# Altium schematic symbol library Regulator_Switching.SchLib: 1070 symbols (part 5 of 9) (continued)
## NCP1071STCT
designator *  value NCP1071STCT
ki_keywords: SMPS Converter; ki_description: High-Voltage Switcher for Low Power Offline SMPS, 700V Vds, 14W/7.75W, 230V/85-265V, 130kHz, 22Ohm Rds(on), 350mA Ipk, SOT-223; ki_fp_filters: SOT?223*; Footprint: Package_TO_SOT_SMD:SOT-223; Supplier: http://www.onsemi.com/pub/Collateral/NCP1070-D.PDF
footprint SOT-223
pins: 1 VCC (power), 2 FB (in), 3 DRAIN (oc), 4 GND (power)

## NCP1072P065
designator *  value NCP1072P065
ki_keywords: SMPS Converter; ki_description: High-Voltage Switcher for Low Power Offline SMPS, 700V Vds, 19W/10W, 230V/85-265V, 65kHz, 11Ohm Rds(on), 250mA Ipk, DIP-7; ki_fp_filters: DIP*N7*W7.62mm*; Footprint: Package_DIP:DIP-8-N7_W7.62mm; Supplier: http://www.onsemi.com/pub/Collateral/NCP1070-D.PDF
footprint DIP-8-N7_W7.62mm
pins: 1 VCC (power), 2 NC (in) hidden, 3 GND (power), 4 FB (in), 5 DRAIN (oc), 7 GND hidden, 8 GND hidden

## NCP1072P100
designator *  value NCP1072P100
ki_keywords: SMPS Converter; ki_description: High-Voltage Switcher for Low Power Offline SMPS, 700V Vds, 19W/10W, 230V/85-265V, 100kHz, 11Ohm Rds(on), 250mA Ipk, DIP-7; ki_fp_filters: DIP*N7*W7.62mm*; Footprint: Package_DIP:DIP-8-N7_W7.62mm; Supplier: http://www.onsemi.com/pub/Collateral/NCP1070-D.PDF
footprint DIP-8-N7_W7.62mm
pins: 1 VCC (power), 2 NC (in) hidden, 3 GND (power), 4 FB (in), 5 DRAIN (oc), 7 GND hidden, 8 GND hidden

## NCP1072P130
designator *  value NCP1072P130
ki_keywords: SMPS Converter; ki_description: High-Voltage Switcher for Low Power Offline SMPS, 700V Vds, 19W/10W, 230V/85-265V, 130kHz, 11Ohm Rds(on), 250mA Ipk, DIP-7; ki_fp_filters: DIP*N7*W7.62mm*; Footprint: Package_DIP:DIP-8-N7_W7.62mm; Supplier: http://www.onsemi.com/pub/Collateral/NCP1070-D.PDF
footprint DIP-8-N7_W7.62mm
pins: 1 VCC (power), 2 NC (in) hidden, 3 GND (power), 4 FB (in), 5 DRAIN (oc), 7 GND hidden, 8 GND hidden

## NCP1072STAT
designator *  value NCP1072STAT
ki_keywords: SMPS Converter; ki_description: High-Voltage Switcher for Low Power Offline SMPS, 700V Vds, 19W/10W, 230V/85-265V, 65kHz, 11Ohm Rds(on), 250mA Ipk, SOT-223; ki_fp_filters: SOT?223*; Footprint: Package_TO_SOT_SMD:SOT-223; Supplier: http://www.onsemi.com/pub/Collateral/NCP1070-D.PDF
footprint SOT-223
pins: 1 VCC (power), 2 FB (in), 3 DRAIN (oc), 4 GND (power)

## NCP1072STBT
designator *  value NCP1072STBT
ki_keywords: SMPS Converter; ki_description: High-Voltage Switcher for Low Power Offline SMPS, 700V Vds, 19W/10W, 230V/85-265V, 100kHz, 11Ohm Rds(on), 250mA Ipk, SOT-223; ki_fp_filters: SOT?223*; Footprint: Package_TO_SOT_SMD:SOT-223; Supplier: http://www.onsemi.com/pub/Collateral/NCP1070-D.PDF
footprint SOT-223
pins: 1 VCC (power), 2 FB (in), 3 DRAIN (oc), 4 GND (power)

## NCP1072STCT
designator *  value NCP1072STCT
ki_keywords: SMPS Converter; ki_description: High-Voltage Switcher for Low Power Offline SMPS, 700V Vds, 19W/10W, 230V/85-265V, 130kHz, 11Ohm Rds(on), 250mA Ipk, SOT-223; ki_fp_filters: SOT?223*; Footprint: Package_TO_SOT_SMD:SOT-223; Supplier: http://www.onsemi.com/pub/Collateral/NCP1070-D.PDF
footprint SOT-223
pins: 1 VCC (power), 2 FB (in), 3 DRAIN (oc), 4 GND (power)

## NCP1075P065
designator *  value NCP1075P065
ki_keywords: SMPS Converter; ki_description: High-Voltage Switcher for Low Power Offline SMPS, 700V Vds, 19W/10W, 230V/85-265V, 65kHz, 11Ohm Rds(on), 450mA Ipk, DIP-7; ki_fp_filters: DIP*N7*W7.62mm*; Footprint: Package_DIP:DIP-8-N7_W7.62mm; Supplier: http://www.onsemi.com/pub/Collateral/NCP1070-D.PDF
footprint DIP-8-N7_W7.62mm
pins: 1 VCC (power), 2 NC (in) hidden, 3 GND (power), 4 FB (in), 5 DRAIN (oc), 7 GND hidden, 8 GND hidden

## NCP1075P100
designator *  value NCP1075P100
ki_keywords: SMPS Converter; ki_description: High-Voltage Switcher for Low Power Offline SMPS, 700V Vds, 19W/10W, 230V/85-265V, 100kHz, 11Ohm Rds(on), 450mA Ipk, DIP-7; ki_fp_filters: DIP*N7*W7.62mm*; Footprint: Package_DIP:DIP-8-N7_W7.62mm; Supplier: http://www.onsemi.com/pub/Collateral/NCP1070-D.PDF
footprint DIP-8-N7_W7.62mm
pins: 1 VCC (power), 2 NC (in) hidden, 3 GND (power), 4 FB (in), 5 DRAIN (oc), 7 GND hidden, 8 GND hidden

## NCP1075P130
designator *  value NCP1075P130
ki_keywords: SMPS Converter; ki_description: High-Voltage Switcher for Low Power Offline SMPS, 700V Vds, 19W/10W, 230V/85-265V, 130kHz, 11Ohm Rds(on), 450mA Ipk, DIP-7; ki_fp_filters: DIP*N7*W7.62mm*; Footprint: Package_DIP:DIP-8-N7_W7.62mm; Supplier: http://www.onsemi.com/pub/Collateral/NCP1070-D.PDF
footprint DIP-8-N7_W7.62mm
pins: 1 VCC (power), 2 NC (in) hidden, 3 GND (power), 4 FB (in), 5 DRAIN (oc), 7 GND hidden, 8 GND hidden

## NCP1075STAT
designator *  value NCP1075STAT
ki_keywords: SMPS Converter; ki_description: High-Voltage Switcher for Low Power Offline SMPS, 700V Vds, 19W/10W, 230V/85-265V, 65kHz, 11Ohm Rds(on), 450mA Ipk, SOT-223; ki_fp_filters: SOT?223*; Footprint: Package_TO_SOT_SMD:SOT-223; Supplier: http://www.onsemi.com/pub/Collateral/NCP1070-D.PDF
footprint SOT-223
pins: 1 VCC (power), 2 FB (in), 3 DRAIN (oc), 4 GND (power)

## NCP1075STBT
designator *  value NCP1075STBT
ki_keywords: SMPS Converter; ki_description: High-Voltage Switcher for Low Power Offline SMPS, 700V Vds, 19W/10W, 230V/85-265V, 100kHz, 11Ohm Rds(on), 450mA Ipk, SOT-223; ki_fp_filters: SOT?223*; Footprint: Package_TO_SOT_SMD:SOT-223; Supplier: http://www.onsemi.com/pub/Collateral/NCP1070-D.PDF
footprint SOT-223
pins: 1 VCC (power), 2 FB (in), 3 DRAIN (oc), 4 GND (power)

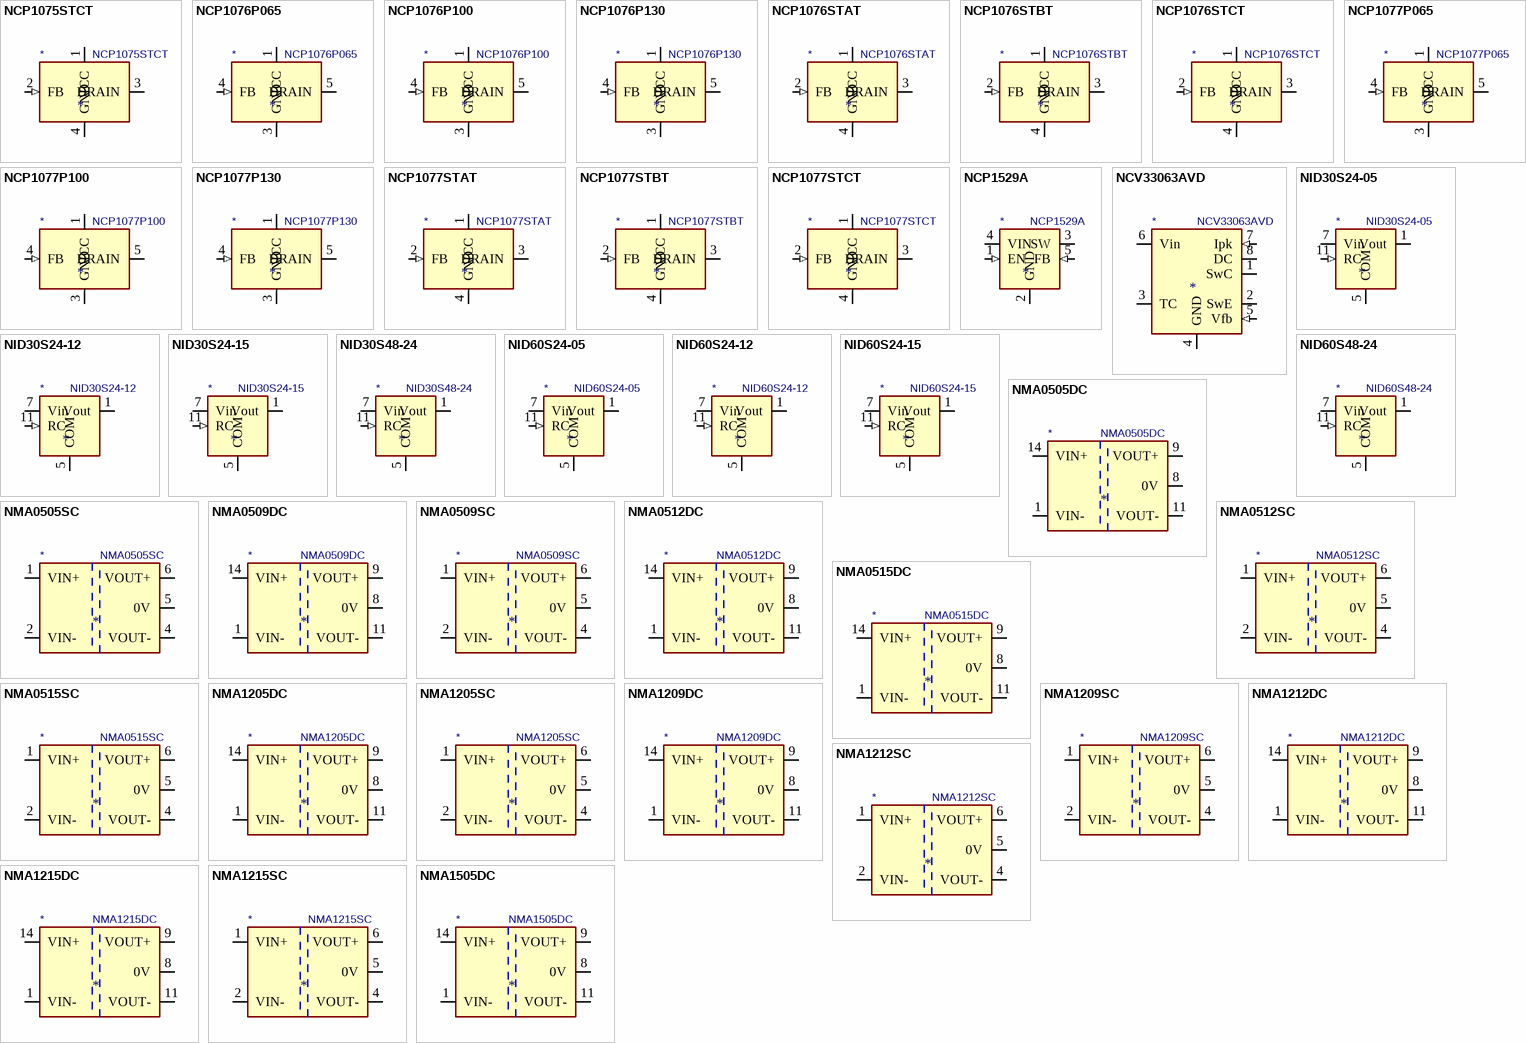
[diagram p15: symbols NCP1075STCT to NMA1505DC]

## NCP1075STCT
designator *  value NCP1075STCT
ki_keywords: SMPS Converter; ki_description: High-Voltage Switcher for Low Power Offline SMPS, 700V Vds, 19W/10W, 230V/85-265V, 130kHz, 11Ohm Rds(on), 450mA Ipk, SOT-223; ki_fp_filters: SOT?223*; Footprint: Package_TO_SOT_SMD:SOT-223; Supplier: http://www.onsemi.com/pub/Collateral/NCP1070-D.PDF
footprint SOT-223
pins: 1 VCC (power), 2 FB (in), 3 DRAIN (oc), 4 GND (power)

## NCP1076P065
designator *  value NCP1076P065
ki_keywords: SMPS Converter; ki_description: High-Voltage Switcher for Low Power Offline SMPS, 700V Vds, 25W/15W, 230V/85-265V, 65kHz, 4.7Ohm Rds(on), 650mA Ipk, DIP-7; ki_fp_filters: DIP*N7*W7.62mm*; Footprint: Package_DIP:DIP-8-N7_W7.62mm; Supplier: http://www.onsemi.com/pub/Collateral/NCP1070-D.PDF
footprint DIP-8-N7_W7.62mm
pins: 1 VCC (power), 2 NC (in) hidden, 3 GND (power), 4 FB (in), 5 DRAIN (oc), 7 GND hidden, 8 GND hidden

## NCP1076P100
designator *  value NCP1076P100
ki_keywords: SMPS Converter; ki_description: High-Voltage Switcher for Low Power Offline SMPS, 700V Vds, 25W/15W, 230V/85-265V, 100kHz, 4.7Ohm Rds(on), 650mA Ipk, DIP-7; ki_fp_filters: DIP*N7*W7.62mm*; Footprint: Package_DIP:DIP-8-N7_W7.62mm; Supplier: http://www.onsemi.com/pub/Collateral/NCP1070-D.PDF
footprint DIP-8-N7_W7.62mm
pins: 1 VCC (power), 2 NC (in) hidden, 3 GND (power), 4 FB (in), 5 DRAIN (oc), 7 GND hidden, 8 GND hidden

## NCP1076P130
designator *  value NCP1076P130
ki_keywords: SMPS Converter; ki_description: High-Voltage Switcher for Low Power Offline SMPS, 700V Vds, 25W/15W, 230V/85-265V, 130kHz, 4.7Ohm Rds(on), 650mA Ipk, DIP-7; ki_fp_filters: DIP*N7*W7.62mm*; Footprint: Package_DIP:DIP-8-N7_W7.62mm; Supplier: http://www.onsemi.com/pub/Collateral/NCP1070-D.PDF
footprint DIP-8-N7_W7.62mm
pins: 1 VCC (power), 2 NC (in) hidden, 3 GND (power), 4 FB (in), 5 DRAIN (oc), 7 GND hidden, 8 GND hidden

## NCP1076STAT
designator *  value NCP1076STAT
ki_keywords: SMPS Converter; ki_description: High-Voltage Switcher for Low Power Offline SMPS, 700V Vds, 25W/15W, 230V/85-265V, 65kHz, 4.7Ohm Rds(on), 650mA Ipk, SOT-223; ki_fp_filters: SOT?223*; Footprint: Package_TO_SOT_SMD:SOT-223; Supplier: http://www.onsemi.com/pub/Collateral/NCP1070-D.PDF
footprint SOT-223
pins: 1 VCC (power), 2 FB (in), 3 DRAIN (oc), 4 GND (power)

## NCP1076STBT
designator *  value NCP1076STBT
ki_keywords: SMPS Converter; ki_description: High-Voltage Switcher for Low Power Offline SMPS, 700V Vds, 25W/15W, 230V/85-265V, 100kHz, 4.7Ohm Rds(on), 650mA Ipk, SOT-223; ki_fp_filters: SOT?223*; Footprint: Package_TO_SOT_SMD:SOT-223; Supplier: http://www.onsemi.com/pub/Collateral/NCP1070-D.PDF
footprint SOT-223
pins: 1 VCC (power), 2 FB (in), 3 DRAIN (oc), 4 GND (power)

## NCP1076STCT
designator *  value NCP1076STCT
ki_keywords: SMPS Converter; ki_description: High-Voltage Switcher for Low Power Offline SMPS, 700V Vds, 25W/15W, 230V/85-265V, 130kHz, 4.7Ohm Rds(on), 650mA Ipk, SOT-223; ki_fp_filters: SOT?223*; Footprint: Package_TO_SOT_SMD:SOT-223; Supplier: http://www.onsemi.com/pub/Collateral/NCP1070-D.PDF
footprint SOT-223
pins: 1 VCC (power), 2 FB (in), 3 DRAIN (oc), 4 GND (power)

## NCP1077P065
designator *  value NCP1077P065
ki_keywords: SMPS Converter; ki_description: High-Voltage Switcher for Low Power Offline SMPS, 700V Vds, 25W/15W, 230V/85-265V, 65kHz, 4.7Ohm Rds(on), 800mA Ipk, DIP-7; ki_fp_filters: DIP*N7*W7.62mm*; Footprint: Package_DIP:DIP-8-N7_W7.62mm; Supplier: http://www.onsemi.com/pub/Collateral/NCP1070-D.PDF
footprint DIP-8-N7_W7.62mm
pins: 1 VCC (power), 2 NC (in) hidden, 3 GND (power), 4 FB (in), 5 DRAIN (oc), 7 GND hidden, 8 GND hidden

## NCP1077P100
designator *  value NCP1077P100
ki_keywords: SMPS Converter; ki_description: High-Voltage Switcher for Low Power Offline SMPS, 700V Vds, 25W/15W, 230V/85-265V, 100kHz, 4.7Ohm Rds(on), 800mA Ipk, DIP-7; ki_fp_filters: DIP*N7*W7.62mm*; Footprint: Package_DIP:DIP-8-N7_W7.62mm; Supplier: http://www.onsemi.com/pub/Collateral/NCP1070-D.PDF
footprint DIP-8-N7_W7.62mm
pins: 1 VCC (power), 2 NC (in) hidden, 3 GND (power), 4 FB (in), 5 DRAIN (oc), 7 GND hidden, 8 GND hidden

## NCP1077P130
designator *  value NCP1077P130
ki_keywords: SMPS Converter; ki_description: High-Voltage Switcher for Low Power Offline SMPS, 700V Vds, 25W/15W, 230V/85-265V, 130kHz, 4.7Ohm Rds(on), 800mA Ipk, DIP-7; ki_fp_filters: DIP*N7*W7.62mm*; Footprint: Package_DIP:DIP-8-N7_W7.62mm; Supplier: http://www.onsemi.com/pub/Collateral/NCP1070-D.PDF
footprint DIP-8-N7_W7.62mm
pins: 1 VCC (power), 2 NC (in) hidden, 3 GND (power), 4 FB (in), 5 DRAIN (oc), 7 GND hidden, 8 GND hidden

## NCP1077STAT
designator *  value NCP1077STAT
ki_keywords: SMPS Converter; ki_description: High-Voltage Switcher for Low Power Offline SMPS, 700V Vds, 25W/15W, 230V/85-265V, 65kHz, 4.7Ohm Rds(on), 800mA Ipk, SOT-223; ki_fp_filters: SOT?223*; Footprint: Package_TO_SOT_SMD:SOT-223; Supplier: http://www.onsemi.com/pub/Collateral/NCP1070-D.PDF
footprint SOT-223
pins: 1 VCC (power), 2 FB (in), 3 DRAIN (oc), 4 GND (power)

## NCP1077STBT
designator *  value NCP1077STBT
ki_keywords: SMPS Converter; ki_description: High-Voltage Switcher for Low Power Offline SMPS, 700V Vds, 25W/15W, 230V/85-265V, 100kHz, 4.7Ohm Rds(on), 800mA Ipk, SOT-223; ki_fp_filters: SOT?223*; Footprint: Package_TO_SOT_SMD:SOT-223; Supplier: http://www.onsemi.com/pub/Collateral/NCP1070-D.PDF
footprint SOT-223
pins: 1 VCC (power), 2 FB (in), 3 DRAIN (oc), 4 GND (power)

## NCP1077STCT
designator *  value NCP1077STCT
ki_keywords: SMPS Converter; ki_description: High-Voltage Switcher for Low Power Offline SMPS, 700V Vds, 25W/15W, 230V/85-265V, 130kHz, 4.7Ohm Rds(on), 800mA Ipk, SOT-223; ki_fp_filters: SOT?223*; Footprint: Package_TO_SOT_SMD:SOT-223; Supplier: http://www.onsemi.com/pub/Collateral/NCP1070-D.PDF
footprint SOT-223
pins: 1 VCC (power), 2 FB (in), 3 DRAIN (oc), 4 GND (power)

## NCP1529A
designator *  value NCP1529A
ki_keywords: Step-Down Buck DC-DC Regulator Adjustable; ki_description: 1.7MHz, 1A, High Efficiency, Low Ripple, Adjustable Output Voltage Step-down Converter, SOT-23-5; ki_fp_filters: SOT?23*; Footprint: Package_TO_SOT_SMD:SOT-23-5; Supplier: https://www.onsemi.com/pub/Collateral/NCP1529-D.PDF
footprint SOT-23-5
pins: 1 EN (in), 2 GND (power), 3 SW (power), 4 VIN (power), 5 FB (in)

## NCV33063AVD
designator *  value NCV33063AVD
ki_keywords: smps buck boost inverting; ki_description: 1.5A, step-up/down/inverting switching regulator, 3-40V Vin, 100kHz, SO-8; ki_fp_filters: SOIC*3.9x4.9mm*P1.27mm*; Footprint: Package_SO:SOIC-8_3.9x4.9mm_P1.27mm; Supplier: http://www.onsemi.com/pub_link/Collateral/MC34063A-D.PDF
footprint SOIC-8_3.9x4.9mm_P1.27mm
pins: 1 SwC (oc), 2 SwE (oe), 3 TC, 4 GND (power), 5 Vfb (in), 6 Vin (power), 7 Ipk (in), 8 DC (oc)

## NID30S24-05
designator *  value NID30S24-05
ki_keywords: Step-Down Converter Module DC/DC; ki_description: 2.5A/12.5W Step Down Converter Module, fixed 5V Output Voltage, 250kHz, 20-53V Input Voltage; ki_fp_filters: Converter*DCDC*MeanWell*NID30*THT*; Footprint: Converter_DCDC:Converter_DCDC_MeanWell_NID30_THT; Supplier: http://www.meanwell.com/webapp/product/search.aspx?prod=nid30
footprint Converter_DCDC_MeanWell_NID30_THT
pins: 1 Vout (power), 2 Vout hidden, 3 Vout hidden, 4 Vout hidden, 5 COM (power), 6 COM hidden, 7 Vin (power), 8 Vin hidden, 9 NC (in) hidden, 10 NC (in) hidden, 11 RC (in)

## NID30S24-12
designator *  value NID30S24-12
ki_keywords: Step-Down Converter Module DC/DC; ki_description: 2.5A/30W Step Down Converter Module, fixed 12V Output Voltage, 250kHz, 20-53V Input Voltage; ki_fp_filters: Converter*DCDC*MeanWell*NID30*THT*; Footprint: Converter_DCDC:Converter_DCDC_MeanWell_NID30_THT; Supplier: http://www.meanwell.com/webapp/product/search.aspx?prod=nid30
footprint Converter_DCDC_MeanWell_NID30_THT
pins: 1 Vout (power), 2 Vout hidden, 3 Vout hidden, 4 Vout hidden, 5 COM (power), 6 COM hidden, 7 Vin (power), 8 Vin hidden, 9 NC (in) hidden, 10 NC (in) hidden, 11 RC (in)

## NID30S24-15
designator *  value NID30S24-15
ki_keywords: Step-Down Converter Module DC/DC; ki_description: 2.5A/30W Step Down Converter Module, fixed 15V Output Voltage, 250kHz, 20-53V Input Voltage; ki_fp_filters: Converter*DCDC*MeanWell*NID30*THT*; Footprint: Converter_DCDC:Converter_DCDC_MeanWell_NID30_THT; Supplier: http://www.meanwell.com/webapp/product/search.aspx?prod=nid30
footprint Converter_DCDC_MeanWell_NID30_THT
pins: 1 Vout (power), 2 Vout hidden, 3 Vout hidden, 4 Vout hidden, 5 COM (power), 6 COM hidden, 7 Vin (power), 8 Vin hidden, 9 NC (in) hidden, 10 NC (in) hidden, 11 RC (in)

## NID30S48-24
designator *  value NID30S48-24
ki_keywords: Step-Down Converter Module DC/DC; ki_description: 1.25A/30W Step Down Converter Module, fixed 24V Output Voltage, 250kHz, 30-53V Input Voltage; ki_fp_filters: Converter*DCDC*MeanWell*NID30*THT*; Footprint: Converter_DCDC:Converter_DCDC_MeanWell_NID30_THT; Supplier: http://www.meanwell.com/webapp/product/search.aspx?prod=nid30
footprint Converter_DCDC_MeanWell_NID30_THT
pins: 1 Vout (power), 2 Vout hidden, 3 Vout hidden, 4 Vout hidden, 5 COM (power), 6 COM hidden, 7 Vin (power), 8 Vin hidden, 9 NC (in) hidden, 10 NC (in) hidden, 11 RC (in)

## NID60S24-05
designator *  value NID60S24-05
ki_keywords: Step-Down Converter Module DC/DC; ki_description: 4A/20W Step Down Converter Module, fixed 5V Output Voltage, 250kHz, 20-53V Input Voltage; ki_fp_filters: Converter*DCDC*MeanWell*NID60*; Footprint: Converter_DCDC:Converter_DCDC_MeanWell_NID60_THT; Supplier: http://www.meanwell.com/78ddf876-a86c-4a52-8a41-4ee24dd9913d
footprint Converter_DCDC_MeanWell_NID60_THT
pins: 1 Vout (power), 2 Vout hidden, 3 Vout hidden, 4 Vout hidden, 5 COM (power), 6 COM hidden, 7 Vin (power), 8 Vin hidden, 9 NC (in) hidden, 10 NC (in) hidden, 11 RC (in)

## NID60S24-12
designator *  value NID60S24-12
ki_keywords: Step-Down Converter Module DC/DC; ki_description: 4A/48W Step Down Converter Module, fixed 12V Output Voltage, 250kHz, 20-53V Input Voltage; ki_fp_filters: Converter*DCDC*MeanWell*NID60*; Footprint: Converter_DCDC:Converter_DCDC_MeanWell_NID60_THT; Supplier: http://www.meanwell.com/78ddf876-a86c-4a52-8a41-4ee24dd9913d
footprint Converter_DCDC_MeanWell_NID60_THT
pins: 1 Vout (power), 2 Vout hidden, 3 Vout hidden, 4 Vout hidden, 5 COM (power), 6 COM hidden, 7 Vin (power), 8 Vin hidden, 9 NC (in) hidden, 10 NC (in) hidden, 11 RC (in)

## NID60S24-15
designator *  value NID60S24-15
ki_keywords: Step-Down Converter Module DC/DC; ki_description: 4A/60W Step Down Converter Module, fixed 15V Output Voltage, 250kHz, 20-53V Input Voltage; ki_fp_filters: Converter*DCDC*MeanWell*NID60*; Footprint: Converter_DCDC:Converter_DCDC_MeanWell_NID60_THT; Supplier: http://www.meanwell.com/78ddf876-a86c-4a52-8a41-4ee24dd9913d
footprint Converter_DCDC_MeanWell_NID60_THT
pins: 1 Vout (power), 2 Vout hidden, 3 Vout hidden, 4 Vout hidden, 5 COM (power), 6 COM hidden, 7 Vin (power), 8 Vin hidden, 9 NC (in) hidden, 10 NC (in) hidden, 11 RC (in)

## NID60S48-24
designator *  value NID60S48-24
ki_keywords: Step-Down Converter Module DC/DC; ki_description: 2.5A/60W Step Down Converter Module, fixed 24V Output Voltage, 250kHz, 30-53V Input Voltage; ki_fp_filters: Converter*DCDC*MeanWell*NID60*; Footprint: Converter_DCDC:Converter_DCDC_MeanWell_NID60_THT; Supplier: http://www.meanwell.com/78ddf876-a86c-4a52-8a41-4ee24dd9913d
footprint Converter_DCDC_MeanWell_NID60_THT
pins: 1 Vout (power), 2 Vout hidden, 3 Vout hidden, 4 Vout hidden, 5 COM (power), 6 COM hidden, 7 Vin (power), 8 Vin hidden, 9 NC (in) hidden, 10 NC (in) hidden, 11 RC (in)

## NMA0505DC
designator *  value NMA0505DC
ki_keywords: Murata isolated isolation dc-dc converter; ki_description: +/-100mA Isolated 1W Dual output DC/DC Converter, 5V Input Voltage, +/-5V Output Voltage, DIP Package; ki_fp_filters: Converter*DCDC*Murata*NMAxxxxDC*; Footprint: Converter_DCDC:Converter_DCDC_Murata_NMAxxxxDC_THT; Supplier: http://power.murata.com/data/power/ncl/kdc_nma.pdf
footprint Converter_DCDC_Murata_NMAxxxxDC_THT
pins: 1 VIN- (power), 7 NC (in) hidden, 8 0V (power), 9 VOUT+ (power), 11 VOUT- (power), 14 VIN+ (power)

## NMA0505SC
designator *  value NMA0505SC
ki_keywords: Murata isolated isolation dc-dc converter; ki_description: +/-100mA Isolated 1W Dual output DC/DC Converter Module, 5V Input Voltage, +/-5V Output Voltage, SIP3; ki_fp_filters: Converter*DCDC*Murata*NMAxxxxSC*; Footprint: Converter_DCDC:Converter_DCDC_Murata_NMAxxxxSC_THT; Supplier: http://power.murata.com/data/power/ncl/kdc_nma.pdf
footprint Converter_DCDC_Murata_NMAxxxxSC_THT
pins: 1 VIN+ (power), 2 VIN- (power), 4 VOUT- (power), 5 0V (power), 6 VOUT+ (power)

## NMA0509DC
designator *  value NMA0509DC
ki_keywords: Murata isolated isolation dc-dc converter; ki_description: +/-55mA Isolated 1W Dual output DC/DC Converter Module, 5V Input Voltage, +/-9V Output Voltage, DIP Package; ki_fp_filters: Converter*DCDC*Murata*NMAxxxxDC*; Footprint: Converter_DCDC:Converter_DCDC_Murata_NMAxxxxDC_THT; Supplier: http://power.murata.com/data/power/ncl/kdc_nma.pdf
footprint Converter_DCDC_Murata_NMAxxxxDC_THT
pins: 1 VIN- (power), 7 NC (in) hidden, 8 0V (power), 9 VOUT+ (power), 11 VOUT- (power), 14 VIN+ (power)

## NMA0509SC
designator *  value NMA0509SC
ki_keywords: Murata isolated isolation dc-dc converter; ki_description: +/-55mA Isolated 1W Dual output DC/DC Converter Module, 5V Input Voltage, +/-9V Output Voltage, SIP3; ki_fp_filters: Converter*DCDC*Murata*NMAxxxxSC*; Footprint: Converter_DCDC:Converter_DCDC_Murata_NMAxxxxSC_THT; Supplier: http://power.murata.com/data/power/ncl/kdc_nma.pdf
footprint Converter_DCDC_Murata_NMAxxxxSC_THT
pins: 1 VIN+ (power), 2 VIN- (power), 4 VOUT- (power), 5 0V (power), 6 VOUT+ (power)

## NMA0512DC
designator *  value NMA0512DC
ki_keywords: Murata isolated isolation dc-dc converter; ki_description: +/-42mA Isolated 1W Dual output DC/DC Converter Module, 5V Input Voltage, +/-12V Output Voltage, DIP Package; ki_fp_filters: Converter*DCDC*Murata*NMAxxxxDC*; Footprint: Converter_DCDC:Converter_DCDC_Murata_NMAxxxxDC_THT; Supplier: http://power.murata.com/data/power/ncl/kdc_nma.pdf
footprint Converter_DCDC_Murata_NMAxxxxDC_THT
pins: 1 VIN- (power), 7 NC (in) hidden, 8 0V (power), 9 VOUT+ (power), 11 VOUT- (power), 14 VIN+ (power)

## NMA0512SC
designator *  value NMA0512SC
ki_keywords: Murata isolated isolation dc-dc converter; ki_description: +/-42mA Isolated 1W Dual output DC/DC Converter Module, 5V Input Voltage, +/-12V Output Voltage, SIP3; ki_fp_filters: Converter*DCDC*Murata*NMAxxxxSC*; Footprint: Converter_DCDC:Converter_DCDC_Murata_NMAxxxxSC_THT; Supplier: http://power.murata.com/data/power/ncl/kdc_nma.pdf
footprint Converter_DCDC_Murata_NMAxxxxSC_THT
pins: 1 VIN+ (power), 2 VIN- (power), 4 VOUT- (power), 5 0V (power), 6 VOUT+ (power)

## NMA0515DC
designator *  value NMA0515DC
ki_keywords: Murata isolated isolation dc-dc converter; ki_description: +/-33mA Isolated 1W Dual output DC/DC Converter Module, 5V Input Voltage, +/-15V Output Voltage, DIP Package; ki_fp_filters: Converter*DCDC*Murata*NMAxxxxDC*; Footprint: Converter_DCDC:Converter_DCDC_Murata_NMAxxxxDC_THT; Supplier: http://power.murata.com/data/power/ncl/kdc_nma.pdf
footprint Converter_DCDC_Murata_NMAxxxxDC_THT
pins: 1 VIN- (power), 7 NC (in) hidden, 8 0V (power), 9 VOUT+ (power), 11 VOUT- (power), 14 VIN+ (power)

## NMA0515SC
designator *  value NMA0515SC
ki_keywords: Murata isolated isolation dc-dc converter; ki_description: +/-33mA Isolated 1W Dual output DC/DC Converter Module, 5V Input Voltage, +/-15V Output Voltage, SIP3; ki_fp_filters: Converter*DCDC*Murata*NMAxxxxSC*; Footprint: Converter_DCDC:Converter_DCDC_Murata_NMAxxxxSC_THT; Supplier: http://power.murata.com/data/power/ncl/kdc_nma.pdf
footprint Converter_DCDC_Murata_NMAxxxxSC_THT
pins: 1 VIN+ (power), 2 VIN- (power), 4 VOUT- (power), 5 0V (power), 6 VOUT+ (power)

## NMA1205DC
designator *  value NMA1205DC
ki_keywords: Murata isolated isolation dc-dc converter; ki_description: +/-100mA Isolated 1W Dual output DC/DC Converter Module, 12V Input Voltage, +/-5V Output Voltage, DIP Package; ki_fp_filters: Converter*DCDC*Murata*NMAxxxxDC*; Footprint: Converter_DCDC:Converter_DCDC_Murata_NMAxxxxDC_THT; Supplier: http://power.murata.com/data/power/ncl/kdc_nma.pdf
footprint Converter_DCDC_Murata_NMAxxxxDC_THT
pins: 1 VIN- (power), 7 NC (in) hidden, 8 0V (power), 9 VOUT+ (power), 11 VOUT- (power), 14 VIN+ (power)

## NMA1205SC
designator *  value NMA1205SC
ki_keywords: Murata isolated isolation dc-dc converter; ki_description: +/-100mA Isolated 1W Dual output DC/DC Converter Module, 12V Input Voltage, +/-5V Output Voltage, SIP3; ki_fp_filters: Converter*DCDC*Murata*NMAxxxxSC*; Footprint: Converter_DCDC:Converter_DCDC_Murata_NMAxxxxSC_THT; Supplier: http://power.murata.com/data/power/ncl/kdc_nma.pdf
footprint Converter_DCDC_Murata_NMAxxxxSC_THT
pins: 1 VIN+ (power), 2 VIN- (power), 4 VOUT- (power), 5 0V (power), 6 VOUT+ (power)

## NMA1209DC
designator *  value NMA1209DC
ki_keywords: Murata isolated isolation dc-dc converter; ki_description: +/-55mA Isolated 1W Dual output DC/DC Converter Module, 12V Input Voltage, +/-9V Output Voltage, DIP Package; ki_fp_filters: Converter*DCDC*Murata*NMAxxxxDC*; Footprint: Converter_DCDC:Converter_DCDC_Murata_NMAxxxxDC_THT; Supplier: http://power.murata.com/data/power/ncl/kdc_nma.pdf
footprint Converter_DCDC_Murata_NMAxxxxDC_THT
pins: 1 VIN- (power), 7 NC (in) hidden, 8 0V (power), 9 VOUT+ (power), 11 VOUT- (power), 14 VIN+ (power)

## NMA1209SC
designator *  value NMA1209SC
ki_keywords: Murata isolated isolation dc-dc converter; ki_description: +/-55mA Isolated 1W Dual output DC/DC Converter Module, 12V Input Voltage, +/-9V Output Voltage, SIP3; ki_fp_filters: Converter*DCDC*Murata*NMAxxxxSC*; Footprint: Converter_DCDC:Converter_DCDC_Murata_NMAxxxxSC_THT; Supplier: http://power.murata.com/data/power/ncl/kdc_nma.pdf
footprint Converter_DCDC_Murata_NMAxxxxSC_THT
pins: 1 VIN+ (power), 2 VIN- (power), 4 VOUT- (power), 5 0V (power), 6 VOUT+ (power)

## NMA1212DC
designator *  value NMA1212DC
ki_keywords: Murata isolated isolation dc-dc converter; ki_description: +/-42mA Isolated 1W Dual output DC/DC Converter Module, 12V Input Voltage, +/-12V Output Voltage, DIP Package; ki_fp_filters: Converter*DCDC*Murata*NMAxxxxDC*; Footprint: Converter_DCDC:Converter_DCDC_Murata_NMAxxxxDC_THT; Supplier: http://power.murata.com/data/power/ncl/kdc_nma.pdf
footprint Converter_DCDC_Murata_NMAxxxxDC_THT
pins: 1 VIN- (power), 7 NC (in) hidden, 8 0V (power), 9 VOUT+ (power), 11 VOUT- (power), 14 VIN+ (power)

## NMA1212SC
designator *  value NMA1212SC
ki_keywords: Murata isolated isolation dc-dc converter; ki_description: +/-42mA Isolated 1W Dual output DC/DC Converter Module, 12V Input Voltage, +/-12V Output Voltage, SIP3; ki_fp_filters: Converter*DCDC*Murata*NMAxxxxSC*; Footprint: Converter_DCDC:Converter_DCDC_Murata_NMAxxxxSC_THT; Supplier: http://power.murata.com/data/power/ncl/kdc_nma.pdf
footprint Converter_DCDC_Murata_NMAxxxxSC_THT
pins: 1 VIN+ (power), 2 VIN- (power), 4 VOUT- (power), 5 0V (power), 6 VOUT+ (power)

## NMA1215DC
designator *  value NMA1215DC
ki_keywords: Murata isolated isolation dc-dc converter; ki_description: +/-33mA Isolated 1W Dual output DC/DC Converter Module, 12V Input Voltage, +/-15V Output Voltage, DIP Package; ki_fp_filters: Converter*DCDC*Murata*NMAxxxxDC*; Footprint: Converter_DCDC:Converter_DCDC_Murata_NMAxxxxDC_THT; Supplier: http://power.murata.com/data/power/ncl/kdc_nma.pdf
footprint Converter_DCDC_Murata_NMAxxxxDC_THT
pins: 1 VIN- (power), 7 NC (in) hidden, 8 0V (power), 9 VOUT+ (power), 11 VOUT- (power), 14 VIN+ (power)

## NMA1215SC
designator *  value NMA1215SC
ki_keywords: Murata isolated isolation dc-dc converter; ki_description: +/-33mA Isolated 1W Dual output DC/DC Converter Module, 12V Input Voltage, +/-15V Output Voltage, SIP3; ki_fp_filters: Converter*DCDC*Murata*NMAxxxxSC*; Footprint: Converter_DCDC:Converter_DCDC_Murata_NMAxxxxSC_THT; Supplier: http://power.murata.com/data/power/ncl/kdc_nma.pdf
footprint Converter_DCDC_Murata_NMAxxxxSC_THT
pins: 1 VIN+ (power), 2 VIN- (power), 4 VOUT- (power), 5 0V (power), 6 VOUT+ (power)

## NMA1505DC
designator *  value NMA1505DC
ki_keywords: Murata isolated isolation dc-dc converter; ki_description: +/-100mA Isolated 1W Dual output DC/DC Converter Module, 15V Input Voltage, +/-5V Output Voltage, DIP Package; ki_fp_filters: Converter*DCDC*Murata*NMAxxxxDC*; Footprint: Converter_DCDC:Converter_DCDC_Murata_NMAxxxxDC_THT; Supplier: http://power.murata.com/data/power/ncl/kdc_nma.pdf
footprint Converter_DCDC_Murata_NMAxxxxDC_THT
pins: 1 VIN- (power), 7 NC (in) hidden, 8 0V (power), 9 VOUT+ (power), 11 VOUT- (power), 14 VIN+ (power)

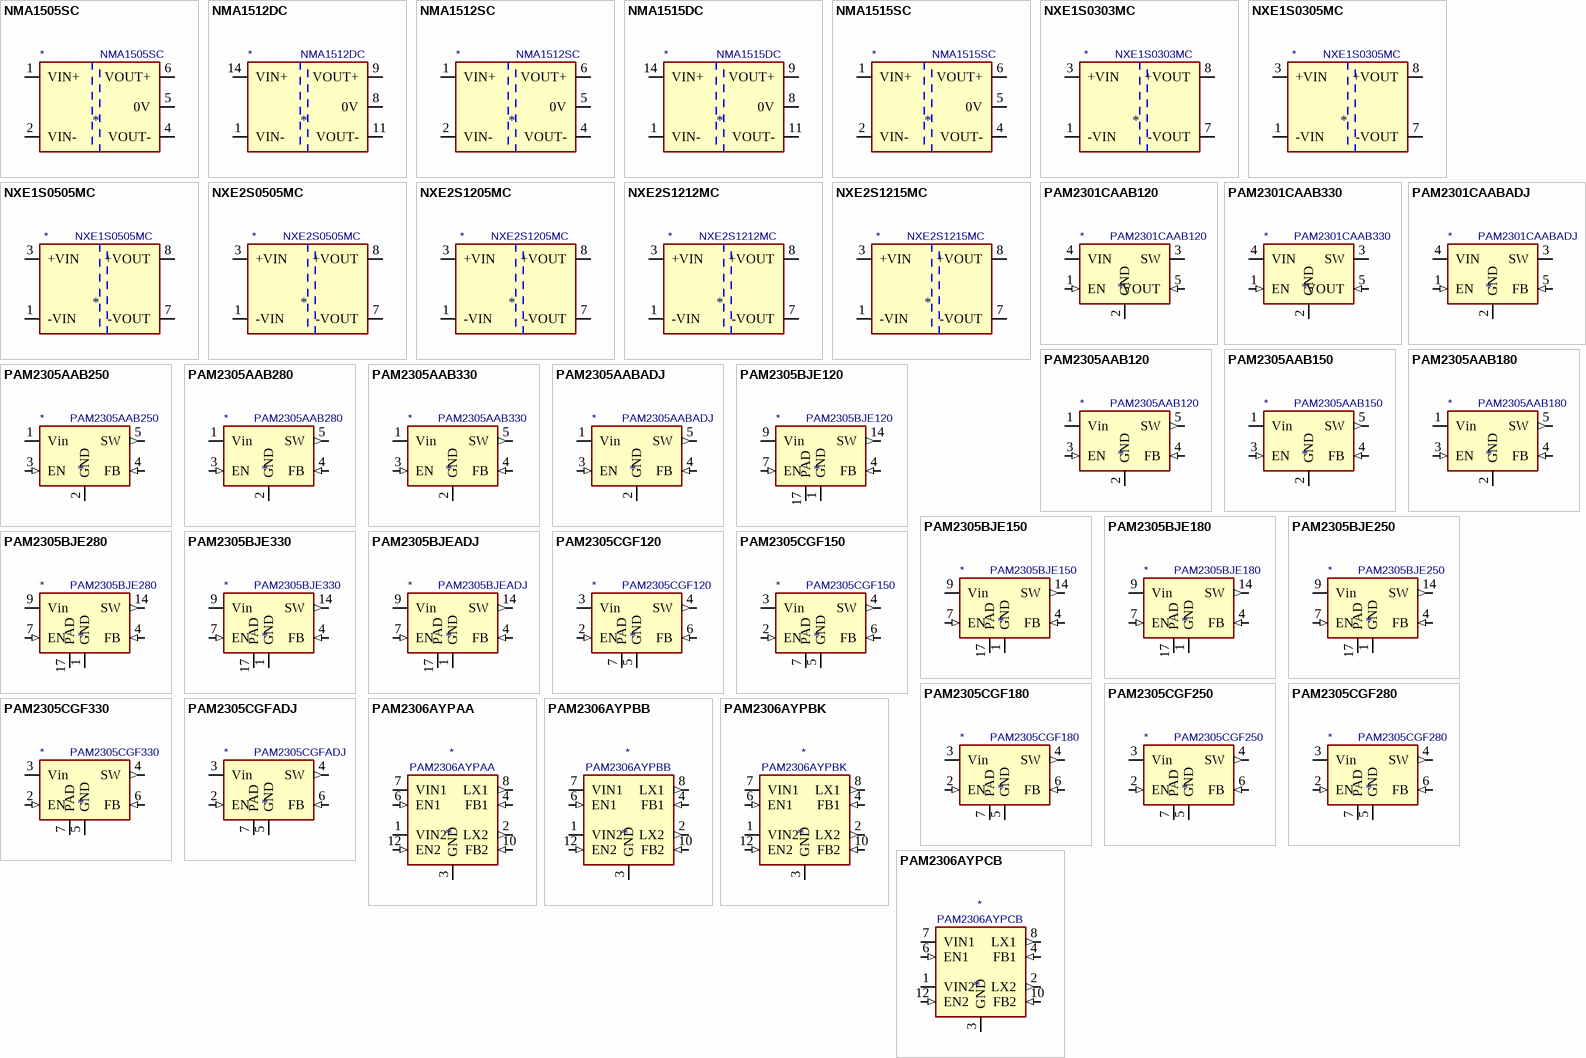
[diagram p16: symbols NMA1505SC to PAM2306AYPCB]

## NMA1505SC
designator *  value NMA1505SC
ki_keywords: Murata isolated isolation dc-dc converter; ki_description: +/-100mA Isolated 1W Dual output DC/DC Converter Module, 15V Input Voltage, +/-5V Output Voltage, SIP3; ki_fp_filters: Converter*DCDC*Murata*NMAxxxxSC*; Footprint: Converter_DCDC:Converter_DCDC_Murata_NMAxxxxSC_THT; Supplier: http://power.murata.com/data/power/ncl/kdc_nma.pdf
footprint Converter_DCDC_Murata_NMAxxxxSC_THT
pins: 1 VIN+ (power), 2 VIN- (power), 4 VOUT- (power), 5 0V (power), 6 VOUT+ (power)

## NMA1512DC
designator *  value NMA1512DC
ki_keywords: Murata isolated isolation dc-dc converter; ki_description: +/-42mA Isolated 1W Dual output DC/DC Converter Module, 15V Input Voltage, +/-12V Output Voltage, DIP Package; ki_fp_filters: Converter*DCDC*Murata*NMAxxxxDC*; Footprint: Converter_DCDC:Converter_DCDC_Murata_NMAxxxxDC_THT; Supplier: http://power.murata.com/data/power/ncl/kdc_nma.pdf
footprint Converter_DCDC_Murata_NMAxxxxDC_THT
pins: 1 VIN- (power), 7 NC (in) hidden, 8 0V (power), 9 VOUT+ (power), 11 VOUT- (power), 14 VIN+ (power)

## NMA1512SC
designator *  value NMA1512SC
ki_keywords: Murata isolated isolation dc-dc converter; ki_description: +/-42mA Isolated 1W Dual output DC/DC Converter Module, 15V Input Voltage, +/-12V Output Voltage, SIP3; ki_fp_filters: Converter*DCDC*Murata*NMAxxxxSC*; Footprint: Converter_DCDC:Converter_DCDC_Murata_NMAxxxxSC_THT; Supplier: http://power.murata.com/data/power/ncl/kdc_nma.pdf
footprint Converter_DCDC_Murata_NMAxxxxSC_THT
pins: 1 VIN+ (power), 2 VIN- (power), 4 VOUT- (power), 5 0V (power), 6 VOUT+ (power)

## NMA1515DC
designator *  value NMA1515DC
ki_keywords: Murata isolated isolation dc-dc converter; ki_description: +/-33mA Isolated 1W Dual output DC/DC Converter Module, 5V Input Voltage, +/-15V Output Voltage, DIP Package; ki_fp_filters: Converter*DCDC*Murata*NMAxxxxDC*; Footprint: Converter_DCDC:Converter_DCDC_Murata_NMAxxxxDC_THT; Supplier: http://power.murata.com/data/power/ncl/kdc_nma.pdf
footprint Converter_DCDC_Murata_NMAxxxxDC_THT
pins: 1 VIN- (power), 7 NC (in) hidden, 8 0V (power), 9 VOUT+ (power), 11 VOUT- (power), 14 VIN+ (power)

## NMA1515SC
designator *  value NMA1515SC
ki_keywords: Murata isolated isolation dc-dc converter; ki_description: +/-33mA Isolated 1W Dual output DC/DC Converter Module, 5V Input Voltage, +/-15V Output Voltage, SIP3; ki_fp_filters: Converter*DCDC*Murata*NMAxxxxSC*; Footprint: Converter_DCDC:Converter_DCDC_Murata_NMAxxxxSC_THT; Supplier: http://power.murata.com/data/power/ncl/kdc_nma.pdf
footprint Converter_DCDC_Murata_NMAxxxxSC_THT
pins: 1 VIN+ (power), 2 VIN- (power), 4 VOUT- (power), 5 0V (power), 6 VOUT+ (power)

## NXE1S0303MC
designator *  value NXE1S0303MC
ki_keywords: isolated isolation dc-dc converter transformer; ki_description: 1W 3.3V to 3.3V 303mA DC-DC Converter with 3kV isolation; ki_fp_filters: Converter*DCDC*Murata*NXExSxxxxMC*; Footprint: Converter_DCDC:Converter_DCDC_Murata_NXExSxxxxMC_SMD; Supplier: https://www.murata.com/products/productdata/8807031865374/kdc-nxe1.pdf
footprint Converter_DCDC_Murata_NXExSxxxxMC_SMD
pins: 1 -VIN (power), 3 +VIN (power), 7 -VOUT (power), 8 +VOUT (power), 14 NC (in) hidden

## NXE1S0305MC
designator *  value NXE1S0305MC
ki_keywords: isolated isolation dc-dc converter transformer; ki_description: 1W 3.3V to 5V 200mA DC-DC Converter with 3kV isolation; ki_fp_filters: Converter*DCDC*Murata*NXExSxxxxMC*; Footprint: Converter_DCDC:Converter_DCDC_Murata_NXExSxxxxMC_SMD; Supplier: https://www.murata.com/products/productdata/8807031865374/kdc-nxe1.pdf
footprint Converter_DCDC_Murata_NXExSxxxxMC_SMD
pins: 1 -VIN (power), 3 +VIN (power), 7 -VOUT (power), 8 +VOUT (power), 14 NC (in) hidden

## NXE1S0505MC
designator *  value NXE1S0505MC
ki_keywords: isolated isolation dc-dc converter transformer; ki_description: 1W 5V to 5V 200mA DC-DC Converter with 3kV isolation; ki_fp_filters: Converter*DCDC*Murata*NXExSxxxxMC*; Footprint: Converter_DCDC:Converter_DCDC_Murata_NXExSxxxxMC_SMD; Supplier: https://www.murata.com/products/productdata/8807031865374/kdc-nxe1.pdf
footprint Converter_DCDC_Murata_NXExSxxxxMC_SMD
pins: 1 -VIN (power), 3 +VIN (power), 7 -VOUT (power), 8 +VOUT (power), 14 NC (in) hidden

## NXE2S0505MC
designator *  value NXE2S0505MC
ki_keywords: isolated isolation dc-dc converter transformer; ki_description: 2W 5V to 5V 400mA DC-DC Converter with 3kV isolation; ki_fp_filters: Converter*DCDC*Murata*NXExSxxxxMC*; Footprint: Converter_DCDC:Converter_DCDC_Murata_NXExSxxxxMC_SMD; Supplier: https://www.murata.com/products/productdata/8807031898142/kdc-nxe2.pdf
footprint Converter_DCDC_Murata_NXExSxxxxMC_SMD
pins: 1 -VIN (power), 3 +VIN (power), 7 -VOUT (power), 8 +VOUT (power), 14 NC (in) hidden

## NXE2S1205MC
designator *  value NXE2S1205MC
ki_keywords: isolated isolation dc-dc converter transformer; ki_description: 2W 12V to 5V 400mA DC-DC Converter with 3kV isolation; ki_fp_filters: Converter*DCDC*Murata*NXExSxxxxMC*; Footprint: Converter_DCDC:Converter_DCDC_Murata_NXExSxxxxMC_SMD; Supplier: https://www.murata.com/products/productdata/8807031898142/kdc-nxe2.pdf
footprint Converter_DCDC_Murata_NXExSxxxxMC_SMD
pins: 1 -VIN (power), 3 +VIN (power), 7 -VOUT (power), 8 +VOUT (power), 14 NC (in) hidden

## NXE2S1212MC
designator *  value NXE2S1212MC
ki_keywords: isolated isolation dc-dc converter transformer; ki_description: 2W 12V to 12V 400mA DC-DC Converter with 3kV isolation; ki_fp_filters: Converter*DCDC*Murata*NXExSxxxxMC*; Footprint: Converter_DCDC:Converter_DCDC_Murata_NXExSxxxxMC_SMD; Supplier: https://www.murata.com/products/productdata/8807031898142/kdc-nxe2.pdf
footprint Converter_DCDC_Murata_NXExSxxxxMC_SMD
pins: 1 -VIN (power), 3 +VIN (power), 7 -VOUT (power), 8 +VOUT (power), 14 NC (in) hidden

## NXE2S1215MC
designator *  value NXE2S1215MC
ki_keywords: isolated isolation dc-dc converter transformer; ki_description: 2W 12V to 15V 400mA DC-DC Converter with 3kV isolation; ki_fp_filters: Converter*DCDC*Murata*NXExSxxxxMC*; Footprint: Converter_DCDC:Converter_DCDC_Murata_NXExSxxxxMC_SMD; Supplier: https://www.murata.com/products/productdata/8807031898142/kdc-nxe2.pdf
footprint Converter_DCDC_Murata_NXExSxxxxMC_SMD
pins: 1 -VIN (power), 3 +VIN (power), 7 -VOUT (power), 8 +VOUT (power), 14 NC (in) hidden

## PAM2301CAAB120
designator *  value PAM2301CAAB120
ki_keywords: Voltage regulator switching buck fixed output analog; ki_description: 800mA, Step-Down DC/DC-Converter, 1.2V Fixed Output Voltage, 1.5MHz, TSOT-23-5; ki_fp_filters: TSOT?23*; Footprint: Package_TO_SOT_SMD:TSOT-23-5; Supplier: https://www.diodes.com/assets/Datasheets/products_inactive_data/PAM2301.pdf
footprint TSOT-23-5
pins: 1 EN (in), 2 GND (power), 3 SW (power), 4 VIN (power), 5 VOUT (in)